# Altium footprint library PCB.PcbLib: 50 footprints (part 4 of 4)
Each footprint in its own frame and in the unit in brackets; x right, y up, seen from the top. Pads: shape width x height; smd on the part's side, far side on the other; paste and mask are expansions set on the pad; w line width, h text height; cw(c..) or ccw(c..) is an arc to the next point about the centre after c.
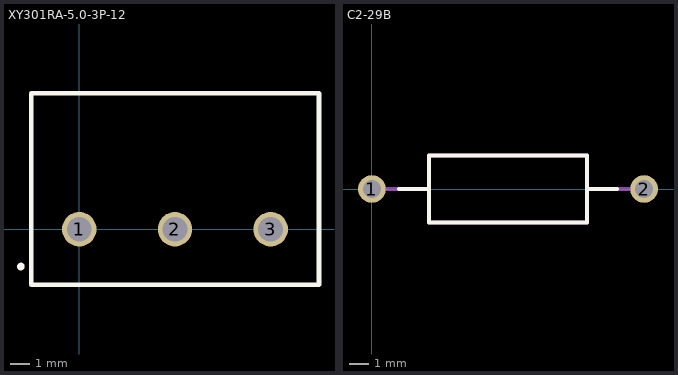
[diagram p3: the footprints below, top view; thin cyan lines are the x and y axes]

## XY301RA-5.0-3P-12 [mm]
height 7.6
pads (3):
  round 1.8 hole 1.3: 1(0,0) 2(5,0) 3(10,0)
Top Overlay:
  circle w0.2: c-3.05,-1.95 r0.1
  lines w0.24: -2.5,-2.9 12.525,-2.9 12.525,7.1 -2.5,7.1 -2.5,-2.9
3D body: height 7.7, standoff 0.1, extent -2.62,-3.02 12.475,7.22

## С2-29В [mm]
height 5
pads (2):
  round 1.4 hole 0.9: 1(0,0) 2(13.75,0)
Top Overlay:
  lines w0.2: 1.375,0 2.875,0 ; 10.875,0 12.375,0 ; 2.875,-1.7 2.875,1.7 10.875,1.7 10.875,-1.7 2.875,-1.7
Top Assembly:
  lines w0.2: 0,0 2.875,0 ; 10.875,0 13.75,0 ; 2.875,-1.7 10.875,-1.7 10.875,1.7 2.875,1.7 2.875,-1.7
  text "'.Designator'" at 4.221,-0.635 h2.4
Mechanical 17:
  text "L=8.0 D=3.5 d=0,6 A=13,75 / вариант формовки выводов 140.02.0304.00.00 / по ГОСТ 29137-91" at 1.592,-0.889 h0.7
3D body "С2-29В(0.125) .stp": height 4.5, standoff -2, extent -0.3,-1.75 14.05,1.75